# Altium schematic symbol library IC_ADI.SCHLIB: 3169 symbols (part 139 of 181) (continued)
## AD9248BSTZ-40 (continued)
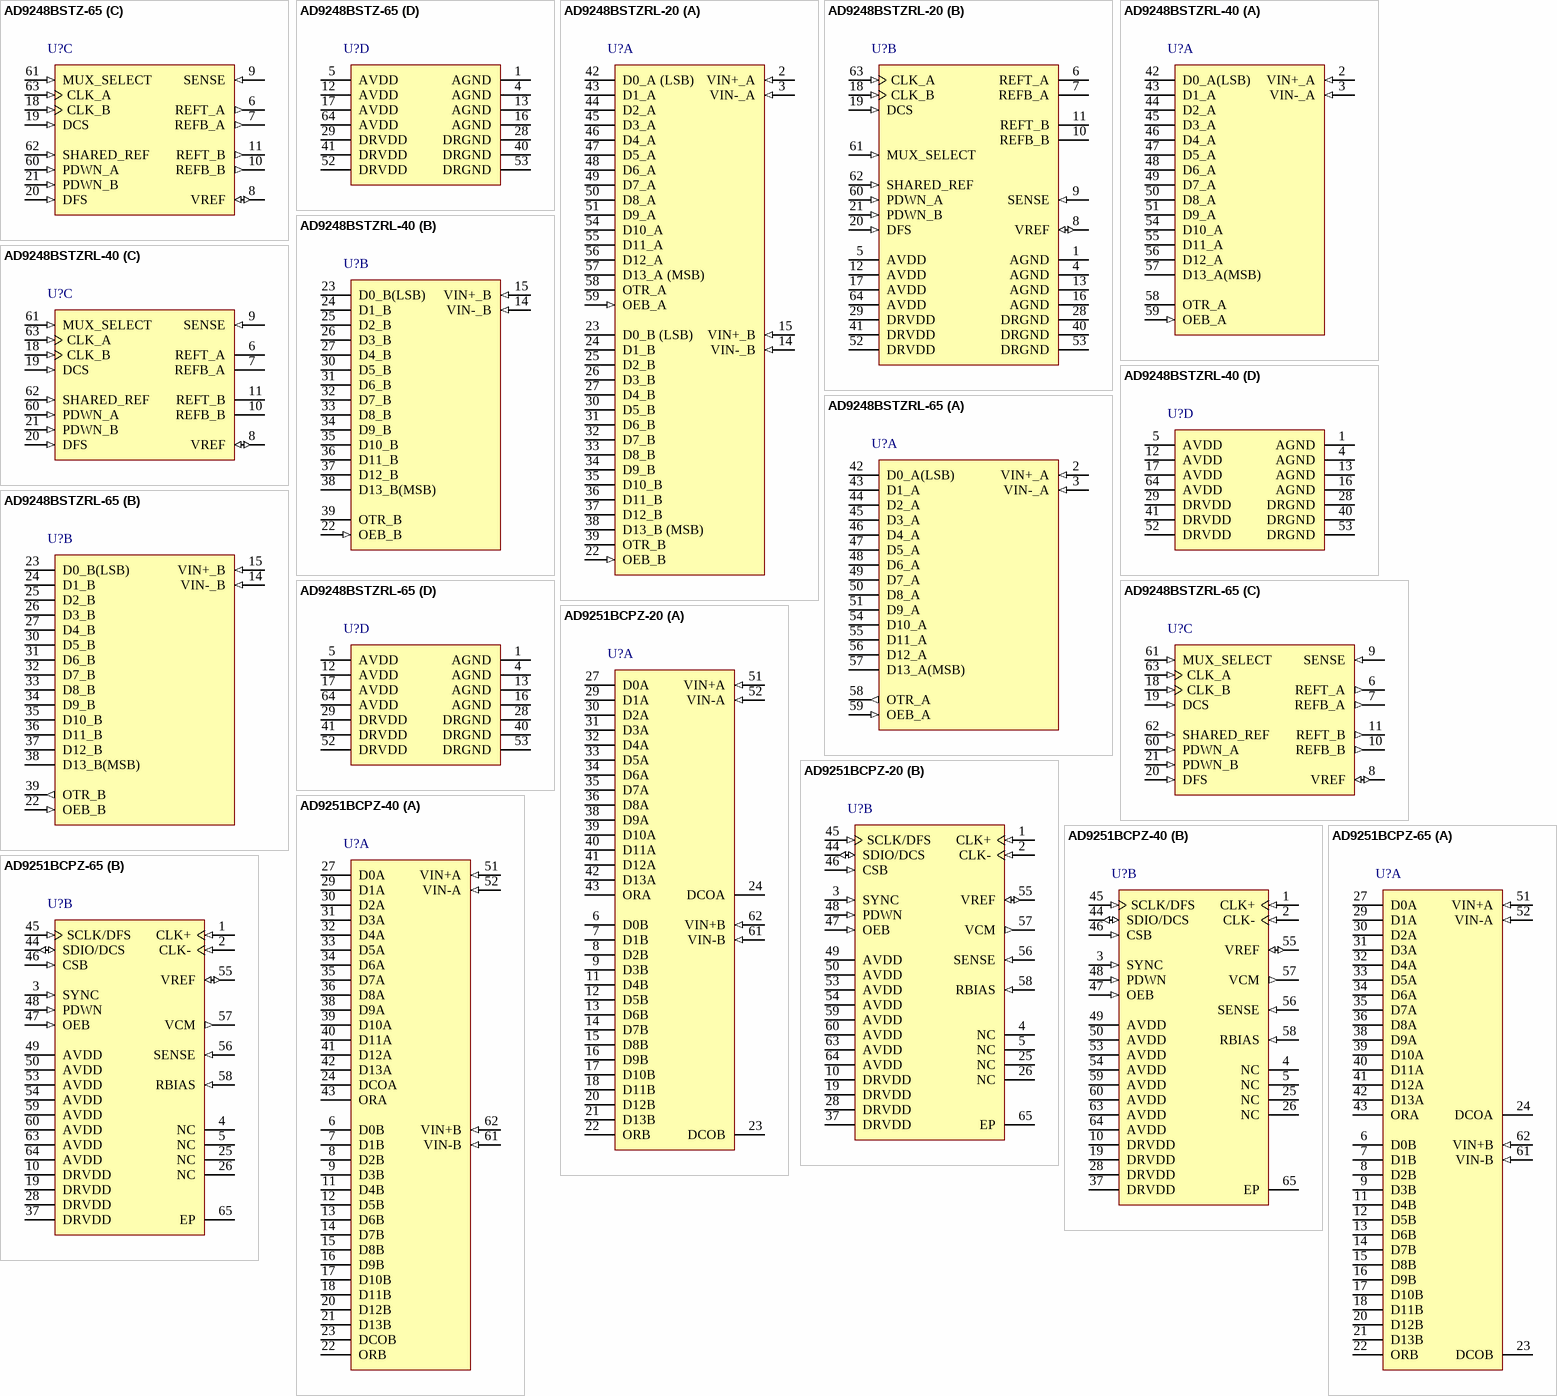
[diagram p116: symbols AD9248BSTZ-65 to AD9251BCPZ-65]

## AD9248BSTZ-65
designator U?
Dual 14-Bit Analog-to-Digital Converter with Parallel Interface, 65MSPS, -40 to +85 degC, ST-64-1, Pb-Free, Tray; Generic Part Number: AD9248-65; PartNumber: AD9248BSTZ-65; Resolution (Bits): 14; Channels: 2; Throughput Rate (SPS): 65M; Interface: Par; DatasheetVersion: Rev.B; PackageVersion: 051706-A; PackageReference: ST-64-1; PackageDescription: 64-Lead Low Profile Quad Flat Package [LQFP]; Supplier Part Number 1: AD9248BSTZ-65-ND; Supplier Part Number 2: 59K7242; Supplier Part Number 3: 584-AD9248BSTZ-65; RoHS: Y; Packing: Tray; Mounting Technology: Surface Mount; Code_JEDEC: MS-026-BBD; ComponentLink1Description: Manufacturer URL; ComponentLink2Description: Datasheet; ComponentLink3Description: Package Specification; ComponentLink4Description: Product URL
footprint LQFP64_0.4MM(10X10) (Footprint not found)
part A pins: 2 VIN+_A (in) "Analog Input Pin (+) for Channel A.", 3 VIN-_A (in) "Analog Input Pin (-) for Channel A.", 42 D0_A(LSB) (hiz) "Channel A Data Output Bits.", 43 D1_A (hiz) "Channel A Data Output Bits.", 44 D2_A (hiz) "Channel A Data Output Bits.", 45 D3_A (hiz) "Channel A Data Output Bits.", 46 D4_A (hiz) "Channel A Data Output Bits.", 47 D5_A (hiz) "Channel A Data Output Bits.", 48 D6_A (hiz) "Channel A Data Output Bits.", 49 D7_A (hiz) "Channel A Data Output Bits.", 50 D8_A (hiz) "Channel A Data Output Bits.", 51 D9_A (hiz) "Channel A Data Output Bits.", 54 D10_A (hiz) "Channel A Data Output Bits.", 55 D11_A (hiz) "Channel A Data Output Bits.", 56 D12_A (hiz) "Channel A Data Output Bits.", 57 D13_A(MSB) (hiz) "Channel A Data Output Bits.", 58 OTR_A (out) "Out-of-Range Indicator for Channel A.", 59 OEB_A (in) "Output Enable Pin for Channel A. Logic 0 enables Data Bus A. Logic 1 sets outputs to High-Z."
part B pins: 14 VIN-_B (in) "Analog Input Pin (-) for Channel B.", 15 VIN+_B (in) "Analog Input Pin (+) for Channel B.", 22 OEB_B (in) "Output Enable Pin for Channel B. Logic 0 enables Data Bus B. Logic 1 sets outputs to High-Z.", 23 D0_B(LSB) (hiz) "Channel B Data Output Bits.", 24 D1_B (hiz) "Channel B Data Output Bits.", 25 D2_B (hiz) "Channel B Data Output Bits.", 26 D3_B (hiz) "Channel B Data Output Bits.", 27 D4_B (hiz) "Channel B Data Output Bits.", 30 D5_B (hiz) "Channel B Data Output Bits.", 31 D6_B (hiz) "Channel B Data Output Bits.", 32 D7_B (hiz) "Channel B Data Output Bits.", 33 D8_B (hiz) "Channel B Data Output Bits.", 34 D9_B (hiz) "Channel B Data Output Bits.", 35 D10_B (hiz) "Channel B Data Output Bits.", 36 D11_B (hiz) "Channel B Data Output Bits.", 37 D12_B (hiz) "Channel B Data Output Bits.", 38 D13_B(MSB) (hiz) "Channel B Data Output Bits.", 39 OTR_B (out) "Out-of-Range Indicator for Channel B."
part C pins: 6 REFT_A (out) "Differential Reference (+) for Channel A.", 7 REFB_A (out) "Differential Reference (-) for Channel A.", 8 VREF (io) "Voltage Reference Input/Output.", 9 SENSE (in) "Reference Mode Selection.", 10 REFB_B (out) "Differential Reference (-) for Channel B.", 11 REFT_B (out) "Differential Reference (+) for Channel B.", 18 CLK_B (in) "Clock Input Pin for Channel B.", 19 DCS (in) "Enable Duty Cycle Stabilizer (DCS) Mode.", 20 DFS (in) "Data Output Format Select Pin (Low for Offset Binary, High for Twos Complement).", 21 PDWN_B (in) "Power-Down Function Selection for Channel B. Logic 0 enables Channel B. Logic 1 powers down Channel B (outputs static, not High-Z).", 60 PDWN_A (in) "Power-Down Function Selection for Channel A. Logic 0 enables Channel A. Logic 1 powers down Channel A (outputs static, not High-Z).", 61 MUX_SELECT (in) "Data Multiplexed Mode. (See Data Format section for how to enable; high setting disables output data multiplexed mode.)", 62 SHARED_REF (in) "Shared Reference Control Pin (Low for Independent Reference Mode, High for Shared Reference Mode).", 63 CLK_A (in) "Clock Input Pin for Channel A."
part D pins: 1 AGND (power) "Analog Ground.", 4 AGND (power) "Analog Ground.", 5 AVDD (power) "Analog Power Supply.", 12 AVDD (power) "Analog Power Supply.", 13 AGND (power) "Analog Ground.", 16 AGND (power) "Analog Ground.", 17 AVDD (power) "Analog Power Supply.", 28 DRGND (power) "Digital Output Ground.", 29 DRVDD (power) "Digital Output Driver Supply. Must be decoupled to DRGND with a minimum 0.1 uF capacitor. Recommended decoupling is 0.1 uF capacitor in parallel with 10 uF capacitor.", 40 DRGND (power) "Digital Output Ground.", 41 DRVDD (power) "Digital Output Driver Supply. Must be decoupled to DRGND with a minimum 0.1 uF capacitor. Recommended decoupling is 0.1 uF capacitor in parallel with 10 uF capacitor.", 52 DRVDD (power) "Digital Output Driver Supply. Must be decoupled to DRGND with a minimum 0.1 uF capacitor. Recommended decoupling is 0.1 uF capacitor in parallel with 10 uF capacitor.", 53 DRGND (power) "Digital Output Ground.", 64 AVDD (power) "Analog Power Supply."

## AD9248BSTZRL-20
designator U?
Dual 14-Bit Analog-to-Digital Converter with Parallel Interface, 20MSPS, -40 to +85 degC, ST-64-1, Pb-Free, Reel; Generic Part Number: AD9248-20; PartNumber: AD9248BSTZRL-20; Resolution (Bits): 14; Channels: 2; Throughput Rate (SPS): 20M; Interface: Par; DatasheetVersion: Rev.B; PackageVersion: 051706-A; PackageReference: ST-64-1; PackageDescription: 64-Lead Low Profile Quad Flat Package [LQFP]; Supplier Part Number 1: N/A; RoHS: Y; Packing: Reel; Mounting Technology: Surface Mount; Code_JEDEC: MS-026-BBD; ComponentLink1Description: Manufacturer URL; ComponentLink2Description: Datasheet; ComponentLink3Description: Package Specification; ComponentLink4Description: Product URL
footprint LQFP64_0.4MM(10X10) (Footprint not found)
part A pins: 2 VIN+_A (in) "Analog Input Pin (+) for Channel A.", 3 VIN-_A (in) "Analog Input Pin (-) for Channel A.", 14 VIN-_B (in) "Analog Input Pin (-) for Channel B.", 15 VIN+_B (in) "Analog Input Pin (+) for Channel B.", 22 OEB_B (in) "Output Enable Pin for Channel B. Logic 0 enables Data Bus B. Logic 1 sets outputs to High-Z.", 23 D0_B (LSB) (hiz) "Channel B Data Output Bits.", 24 D1_B (hiz) "Channel B Data Output Bits.", 25 D2_B (hiz) "Channel B Data Output Bits.", 26 D3_B (hiz) "Channel B Data Output Bits.", 27 D4_B (hiz) "Channel B Data Output Bits.", 30 D5_B (hiz) "Channel B Data Output Bits.", 31 D6_B (hiz) "Channel B Data Output Bits.", 32 D7_B (hiz) "Channel B Data Output Bits.", 33 D8_B (hiz) "Channel B Data Output Bits.", 34 D9_B (hiz) "Channel B Data Output Bits.", 35 D10_B (hiz) "Channel B Data Output Bits.", 36 D11_B (hiz) "Channel B Data Output Bits.", 37 D12_B (hiz) "Channel B Data Output Bits.", 38 D13_B (MSB) (hiz) "Channel B Data Output Bits.", 39 OTR_B (hiz) "Out-of-Range Indicator for Channel B.", 42 D0_A (LSB) (hiz) "Channel A Data Output Bits.", 43 D1_A (hiz) "Channel A Data Output Bits.", 44 D2_A (hiz) "Channel A Data Output Bits.", 45 D3_A (hiz) "Channel A Data Output Bits.", 46 D4_A (hiz) "Channel A Data Output Bits.", 47 D5_A (hiz) "Channel A Data Output Bits.", 48 D6_A (hiz) "Channel A Data Output Bits.", 49 D7_A (hiz) "Channel A Data Output Bits.", 50 D8_A (hiz) "Channel A Data Output Bits.", 51 D9_A (hiz) "Channel A Data Output Bits.", 54 D10_A (hiz) "Channel A Data Output Bits.", 55 D11_A (hiz) "Channel A Data Output Bits.", 56 D12_A (hiz) "Channel A Data Output Bits.", 57 D13_A (MSB) (hiz) "Channel A Data Output Bits.", 58 OTR_A (hiz) "Out-of-Range Indicator for Channel A.", 59 OEB_A (in) "Output Enable Pin for Channel A. Logic 0 enables Data Bus A. Logic 1 sets outputs to High-Z."
part B pins: 1 AGND (power) "Analog Ground.", 4 AGND (power) "Analog Ground.", 5 AVDD (power) "Analog Power Supply.", 6 REFT_A "Differential Reference (+) for Channel A.", 7 REFB_A "Differential Reference (-) for Channel A.", 8 VREF (io) "Voltage Reference Input/Output", 9 SENSE (in) "Reference Mode Selection.", 10 REFB_B "Differential Reference (-) for Channel B.", 11 REFT_B "Differential Reference (+) for Channel B.", 12 AVDD (power) "Analog Power Supply.", 13 AGND (power) "Analog Ground.", 16 AGND (power) "Analog Ground.", 17 AVDD (power) "Analog Power Supply.", 18 CLK_B (in) "Clock Input Pin for Channel B", 19 DCS (in) "Enable Duty Cycle Stabilizer (DCS) Mode", 20 DFS (in) "Data Output Format Select Pin (Low for Offset Binary, High for Twos Complement).", 21 PDWN_B (in) "Power-Down Function Selection for Channel B. Logic 0 enables Channel B. Logic 1 powers down Channel B (outputs static, not High-Z).", 28 DRGND (power) "Digital Output Ground.", 29 DRVDD (power) "Digital Output Driver Supply. Must be decoupled to DRGND with a minimum 0.1 uF capacitor. Recommended decoupling is 0.1 uF capacitor in parallel with 10 uF capacitor", 40 DRGND (power) "Digital Output Ground.", 41 DRVDD (power) "Digital Output Driver Supply. Must be decoupled to DRGND with a minimum 0.1 uF capacitor. Recommended decoupling is 0.1 uF capacitor in parallel with 10 uF capacitor.", 52 DRVDD (power) "Digital Output Ground.", 53 DRGND (power) "Digital Output Driver Supply. Must be decoupled to DRGND with a minimum 0.1 uF capacitor. Recommended decoupling is 0.1 uF capacitor in parallel with 10 uF capacitor.", 60 PDWN_A (in) "Power-Down Function Selection for Channel A.", 61 MUX_SELECT (in) "Data Multiplexed Mode (See Data Format section for how to enable; high setting disables output data multiplexed mode.)", 62 SHARED_REF (in) "Shared Reference Control Pin (Low for Independent Reference Mode, High for Shared Reference Mode).", 63 CLK_A (in) "Clock Input Pin for Channel A.", 64 AVDD (power) "Analog Power Supply."

## AD9248BSTZRL-40
designator U?
Dual 14-Bit Analog-to-Digital Converter with Parallel Interface, 40MSPS, -40 to +85 degC, ST-64-1, Pb-Free, Reel; Generic Part Number: AD9248-40; PartNumber: AD9248BSTZRL-40; Resolution (Bits): 14; Channels: 2; Throughput Rate (SPS): 40M; Interface: Par; DatasheetVersion: Rev.B; PackageVersion: 051706-A; PackageReference: ST-64-1; PackageDescription: 64-Lead Low Profile Quad Flat Package [LQFP]; Supplier Part Number 1: AD9248BSTZRL-40-ND; Supplier Part Number 2: 584-AD9248BSTZR-40; RoHS: Y; Packing: Reel; Mounting Technology: Surface Mount; Code_JEDEC: MS-026-BBD; ComponentLink1Description: Manufacturer URL; ComponentLink2Description: Datasheet; ComponentLink3Description: Package Specification; ComponentLink4Description: Product URL
footprint LQFP64_0.4MM(10X10) (Footprint not found)
part A pins: 2 VIN+_A (in) "Analog Input Pin (+) for Channel A.", 3 VIN-_A (in) "Analog Input Pin (-) for Channel A.", 42 D0_A(LSB) (hiz) "Channel A Data Output Bits.", 43 D1_A (hiz) "Channel A Data Output Bits.", 44 D2_A (hiz) "Channel A Data Output Bits.", 45 D3_A (hiz) "Channel A Data Output Bits.", 46 D4_A (hiz) "Channel A Data Output Bits.", 47 D5_A (hiz) "Channel A Data Output Bits.", 48 D6_A (hiz) "Channel A Data Output Bits.", 49 D7_A (hiz) "Channel A Data Output Bits.", 50 D8_A (hiz) "Channel A Data Output Bits.", 51 D9_A (hiz) "Channel A Data Output Bits.", 54 D10_A (hiz) "Channel A Data Output Bits.", 55 D11_A (hiz) "Channel A Data Output Bits.", 56 D12_A (hiz) "Channel A Data Output Bits.", 57 D13_A(MSB) (hiz) "Channel A Data Output Bits.", 58 OTR_A (hiz) "Out-of-Range Indicator for Channel A.", 59 OEB_A (in) "Output Enable Pin for Channel A. Logic 0 enables Data Bus A. Logic 1 sets outputs to High-Z."
part B pins: 14 VIN-_B (in) "Analog Input Pin (-) for Channel B.", 15 VIN+_B (in) "Analog Input Pin (+) for Channel B.", 22 OEB_B (in) "Output Enable Pin for Channel B. Logic 0 enables Data Bus B. Logic 1 sets outputs to High-Z.", 23 D0_B(LSB) (hiz) "Channel B Data Output Bits.", 24 D1_B (hiz) "Channel B Data Output Bits.", 25 D2_B (hiz) "Channel B Data Output Bits.", 26 D3_B (hiz) "Channel B Data Output Bits.", 27 D4_B (hiz) "Channel B Data Output Bits.", 30 D5_B (hiz) "Channel B Data Output Bits.", 31 D6_B (hiz) "Channel B Data Output Bits.", 32 D7_B (hiz) "Channel B Data Output Bits.", 33 D8_B (hiz) "Channel B Data Output Bits.", 34 D9_B (hiz) "Channel B Data Output Bits.", 35 D10_B (hiz) "Channel B Data Output Bits.", 36 D11_B (hiz) "Channel B Data Output Bits.", 37 D12_B (hiz) "Channel B Data Output Bits.", 38 D13_B(MSB) (hiz) "Channel B Data Output Bits.", 39 OTR_B (hiz) "Out-of-Range Indicator for Channel B."
part C pins: 6 REFT_A "Differential Reference (+) for Channel A.", 7 REFB_A "Differential Reference (-) for Channel A.", 8 VREF (io) "Voltage Reference Input/Output.", 9 SENSE (in) "Reference Mode Selection.", 10 REFB_B "Differential Reference (-) for Channel B.", 11 REFT_B "Differential Reference (+) for Channel B.", 18 CLK_B (in) "Clock Input Pin for Channel B.", 19 DCS (in) "Enable Duty Cycle Stabilizer (DCS) Mode.", 20 DFS (in) "Data Output Format Select Pin (Low for Offset Binary, High for Twos Complement).", 21 PDWN_B (in) "Power-Down Function Selection for Channel B. Logic 0 enables Channel B. Logic 1 powers down Channel B (outputs static, not High-Z).", 60 PDWN_A (in) "Power-Down Function Selection for Channel A. Logic 0 enables Channel A. Logic 1 powers down Channel A (outputs static, not High-Z).", 61 MUX_SELECT (in) "Data Multiplexed Mode. (See Data Format section for how to enable; high setting disables output data multiplexed mode.)", 62 SHARED_REF (in) "Shared Reference Control Pin (Low for Independent Reference Mode, High for Shared Reference Mode).", 63 CLK_A (in) "Clock Input Pin for Channel A."
part D pins: 1 AGND (power) "Analog Ground.", 4 AGND (power) "Analog Ground.", 5 AVDD (power) "Analog Power Supply.", 12 AVDD (power) "Analog Power Supply.", 13 AGND (power) "Analog Ground.", 16 AGND (power) "Analog Ground.", 17 AVDD (power) "Analog Power Supply.", 28 DRGND (power) "Digital Output Ground.", 29 DRVDD (power) "Digital Output Driver Supply. Must be decoupled to DRGND with a minimum 0.1 uF capacitor. Recommended decoupling is 0.1 uF capacitor in parallel with 10 uF capacitor.", 40 DRGND (power) "Digital Output Ground.", 41 DRVDD (power) "Digital Output Driver Supply. Must be decoupled to DRGND with a minimum 0.1 uF capacitor. Recommended decoupling is 0.1 uF capacitor in parallel with 10 uF capacitor.", 52 DRVDD (power) "Digital Output Driver Supply. Must be decoupled to DRGND with a minimum 0.1 uF capacitor. Recommended decoupling is 0.1 uF capacitor in parallel with 10 uF capacitor.", 53 DRGND (power) "Digital Output Ground.", 64 AVDD (power) "Analog Power Supply."

## AD9248BSTZRL-65
designator U?
Dual 14-Bit Analog-to-Digital Converter with Parallel Interface, 65MSPS, -40 to +85 degC, ST-64-1, Pb-Free, Reel; Generic Part Number: AD9248-65; PartNumber: AD9248BSTZRL-65; Resolution (Bits): 14; Channels: 2; Throughput Rate (SPS): 65M; Interface: Par; DatasheetVersion: Rev.B; PackageVersion: 051706-A; PackageReference: ST-64-1; PackageDescription: 64-Lead Low Profile Quad Flat Package [LQFP]; Supplier Part Number 1: AD9248BSTZRL-65-ND; Supplier Part Number 2: 584-AD9248BSTZR-65; RoHS: Y; Packing: Reel; Mounting Technology: Surface Mount; Code_JEDEC: MS-026-BBD; ComponentLink1Description: Manufacturer URL; ComponentLink2Description: Datasheet; ComponentLink3Description: Package Specification; ComponentLink4Description: Product URL
footprint LQFP64_0.4MM(10X10) (Footprint not found)
part A pins: 2 VIN+_A (in) "Analog Input Pin (+) for Channel A.", 3 VIN-_A (in) "Analog Input Pin (-) for Channel A.", 42 D0_A(LSB) (hiz) "Channel A Data Output Bits.", 43 D1_A (hiz) "Channel A Data Output Bits.", 44 D2_A (hiz) "Channel A Data Output Bits.", 45 D3_A (hiz) "Channel A Data Output Bits.", 46 D4_A (hiz) "Channel A Data Output Bits.", 47 D5_A (hiz) "Channel A Data Output Bits.", 48 D6_A (hiz) "Channel A Data Output Bits.", 49 D7_A (hiz) "Channel A Data Output Bits.", 50 D8_A (hiz) "Channel A Data Output Bits.", 51 D9_A (hiz) "Channel A Data Output Bits.", 54 D10_A (hiz) "Channel A Data Output Bits.", 55 D11_A (hiz) "Channel A Data Output Bits.", 56 D12_A (hiz) "Channel A Data Output Bits.", 57 D13_A(MSB) (hiz) "Channel A Data Output Bits.", 58 OTR_A (out) "Out-of-Range Indicator for Channel A.", 59 OEB_A (in) "Output Enable Pin for Channel A. Logic 0 enables Data Bus A. Logic 1 sets outputs to High-Z."
part B pins: 14 VIN-_B (in) "Analog Input Pin (-) for Channel B.", 15 VIN+_B (in) "Analog Input Pin (+) for Channel B.", 22 OEB_B (in) "Output Enable Pin for Channel B. Logic 0 enables Data Bus B. Logic 1 sets outputs to High-Z.", 23 D0_B(LSB) (hiz) "Channel B Data Output Bits.", 24 D1_B (hiz) "Channel B Data Output Bits.", 25 D2_B (hiz) "Channel B Data Output Bits.", 26 D3_B (hiz) "Channel B Data Output Bits.", 27 D4_B (hiz) "Channel B Data Output Bits.", 30 D5_B (hiz) "Channel B Data Output Bits.", 31 D6_B (hiz) "Channel B Data Output Bits.", 32 D7_B (hiz) "Channel B Data Output Bits.", 33 D8_B (hiz) "Channel B Data Output Bits.", 34 D9_B (hiz) "Channel B Data Output Bits.", 35 D10_B (hiz) "Channel B Data Output Bits.", 36 D11_B (hiz) "Channel B Data Output Bits.", 37 D12_B (hiz) "Channel B Data Output Bits.", 38 D13_B(MSB) (hiz) "Channel B Data Output Bits.", 39 OTR_B (out) "Out-of-Range Indicator for Channel B."
part C pins: 6 REFT_A (out) "Differential Reference (+) for Channel A.", 7 REFB_A (out) "Differential Reference (-) for Channel A.", 8 VREF (io) "Voltage Reference Input/Output.", 9 SENSE (in) "Reference Mode Selection.", 10 REFB_B (out) "Differential Reference (-) for Channel B.", 11 REFT_B (out) "Differential Reference (+) for Channel B.", 18 CLK_B (in) "Clock Input Pin for Channel B.", 19 DCS (in) "Enable Duty Cycle Stabilizer (DCS) Mode.", 20 DFS (in) "Data Output Format Select Pin (Low for Offset Binary, High for Twos Complement).", 21 PDWN_B (in) "Power-Down Function Selection for Channel B. Logic 0 enables Channel B. Logic 1 powers down Channel B (outputs static, not High-Z).", 60 PDWN_A (in) "Power-Down Function Selection for Channel A. Logic 0 enables Channel A. Logic 1 powers down Channel A (outputs static, not High-Z).", 61 MUX_SELECT (in) "Data Multiplexed Mode. (See Data Format section for how to enable; high setting disables output data multiplexed mode.)", 62 SHARED_REF (in) "Shared Reference Control Pin (Low for Independent Reference Mode, High for Shared Reference Mode).", 63 CLK_A (in) "Clock Input Pin for Channel A."
part D pins: 1 AGND (power) "Analog Ground.", 4 AGND (power) "Analog Ground.", 5 AVDD (power) "Analog Power Supply.", 12 AVDD (power) "Analog Power Supply.", 13 AGND (power) "Analog Ground.", 16 AGND (power) "Analog Ground.", 17 AVDD (power) "Analog Power Supply.", 28 DRGND (power) "Digital Output Ground.", 29 DRVDD (power) "Digital Output Driver Supply. Must be decoupled to DRGND with a minimum 0.1 uF capacitor. Recommended decoupling is 0.1 uF capacitor in parallel with 10 uF capacitor.", 40 DRGND (power) "Digital Output Ground.", 41 DRVDD (power) "Digital Output Driver Supply. Must be decoupled to DRGND with a minimum 0.1 uF capacitor. Recommended decoupling is 0.1 uF capacitor in parallel with 10 uF capacitor.", 52 DRVDD (power) "Digital Output Driver Supply. Must be decoupled to DRGND with a minimum 0.1 uF capacitor. Recommended decoupling is 0.1 uF capacitor in parallel with 10 uF capacitor.", 53 DRGND (power) "Digital Output Ground.", 64 AVDD (power) "Analog Power Supply."

## AD9251BCPZ-20
designator U?
Dual 14-Bit Analog-to-Digital Converter with Parallel Interface, 1.8 V, 20MSPS, -40 to +85 degC, CP-64-4, Pb-Free, Tray; Generic Part Number: AD9251-20; PartNumber: AD9251BCPZ-20; Resolution (Bits): 14; Channels: 2; Throughput Rate (SPS): 20M; Interface: Par; DatasheetVersion: Rev.A; PackageVersion: 051007-C; PackageReference: CP-64-4; PackageDescription: 64-Lead Lead Frame Chip Scale Package [LFCSP_VQ] 9 x 9 mm Body, Very Thin Quad; Supplier Part Number 1: AD9251BCPZ-20-ND; Supplier Part Number 2: 26R2497; Supplier Part Number 3: 584-AD9251BCPZ-20; RoHS: Y; Packing: Tray; Mounting Technology: Surface Mount; Code_JEDEC: MO-220-VMMD-4; ComponentLink1Description: Manufacturer URL; ComponentLink2Description: Datasheet; ComponentLink3Description: Package Specification; ComponentLink4Description: Product URL
footprint QFN64_0.5-PAD(9X9) (Footprint not found)
part A pins: 6 D0B (hiz) "Channel B Digital Outputs.", 7 D1B (hiz) "Channel B Digital Outputs.", 8 D2B (hiz) "Channel B Digital Outputs.", 9 D3B (hiz) "Channel B Digital Outputs.", 11 D4B (hiz) "Channel B Digital Outputs.", 12 D5B (hiz) "Channel B Digital Outputs.", 13 D6B (hiz) "Channel B Digital Outputs.", 14 D7B (hiz) "Channel B Digital Outputs.", 15 D8B (hiz) "Channel B Digital Outputs.", 16 D9B (hiz) "Channel B Digital Outputs.", 17 D10B (hiz) "Channel B Digital Outputs.", 18 D11B (hiz) "Channel B Digital Outputs.", 20 D12B (hiz) "Channel B Digital Outputs.", 21 D13B (hiz) "Channel B Digital Outputs. D13B = MSB.", 22 ORB (hiz) "Channel B Out-of-Range Digital Output.", 23 DCOB (hiz) "Channel B Data Clock Digital Output.", 24 DCOA (hiz) "Channel A Data Clock Digital Output.", 27 D0A (hiz) "Channel A Digital Outputs.", 29 D1A (hiz) "Channel A Digital Outputs.", 30 D2A (hiz) "Channel A Digital Outputs.", 31 D3A (hiz) "Channel A Digital Outputs.", 32 D4A (hiz) "Channel A Digital Outputs.", 33 D5A (hiz) "Channel A Digital Outputs.", 34 D6A (hiz) "Channel A Digital Outputs.", 35 D7A (hiz) "Channel A Digital Outputs.", 36 D8A (hiz) "Channel A Digital Outputs.", 38 D9A (hiz) "Channel A Digital Outputs.", 39 D10A (hiz) "Channel A Digital Outputs.", 40 D11A (hiz) "Channel A Digital Outputs.", 41 D12A (hiz) "Channel A Digital Outputs.", 42 D13A (hiz) "Channel A Digital Outputs. D13A = MSB.", 43 ORA (hiz) "Channel A Out-of-Range Digital Output.", 51 VIN+A (in) "Channel A Analog Inputs.", 52 VIN-A (in) "Channel A Analog Inputs", 61 VIN-B (in) "Channel B Analog Inputs.", 62 VIN+B (in) "Channel B Analog Inputs."
part B pins: 1 CLK+ (in) "Differential Encode Clock. PECL, LVDS, or 1.8 V CMOS inputs.", 2 CLK- (in) "Differential Encode Clock. PECL, LVDS, or 1.8 V CMOS inputs.", 3 SYNC (in) "Digital Input. SYNC input to clock divider. 30 kohm internal pull-down.", 4 NC "Do Not Connect.", 5 NC "Do Not Connect.", 10 DRVDD (power) "Digital Output Driver Supply (1.8 V to 3.3 V).", 19 DRVDD (power) "Digital Output Driver Supply (1.8 V to 3.3 V).", 25 NC "Do Not Connect.", 26 NC "Do Not Connect.", 28 DRVDD (power) "Digital Output Driver Supply (1.8 V to 3.3 V).", 37 DRVDD (power) "Digital Output Driver Supply (1.8 V to 3.3 V).", 44 SDIO/DCS (io) "SPI Data Input/Output (SDIO). Bidirectional SPI Data I/O in SPI mode. 30 kohm internal pull down in SPI mode.  Duty Cycle Stabilizer (DCS). Static enable input for duty cycle stabilizer in non-SPI mode 30 kohm internal (See Datasheet)", 45 SCLK/DFS (in) "SPI Clock (SCLK) Input in SPI mode. 30 kohm internal pull-down.  Data Format Select (DFS). Static control of data output format in non-SPI mode. 30 kohm internal pull-down.DFS high = twos complement output.  DFS low = offset (See Datasheet)", 46 CSB (in) "SPI Chip Select. Active low enable; 30 kohm internal pull-up.", 47 OEB (in) "Digital Input. Enable Channel A and Channel B digital outputs if low, tristate outputs if high.30 kohm internal pull-down.", 48 PDWN (in) "Digital Input. 30 kΩ internal pull-down.  PDWN high = power-down device.PDWN low =  run device, normal operation.", 49 AVDD (power) "1.8 V Analog Supply Pins.", 50 AVDD (power) "1.8 V Analog Supply Pins.", 53 AVDD (power) "1.8 V Analog Supply Pins.", 54 AVDD (power) "1.8 V Analog Supply Pins.", 55 VREF (io) "Voltage Reference Input/Output.", 56 SENSE (in) "Reference Mode Selection.", 57 VCM (out) "Analog output voltage at midsupply to set common mode of the analog inputs.", 58 RBIAS (in) "Sets Analog Current Bias. Connect to 10 kohm (1% tolerance) resistor to ground.", 59 AVDD (power) "1.8 V Analog Supply Pins.", 60 AVDD (power) "1.8 V Analog Supply Pins.", 63 AVDD (power) "1.8 V Analog Supply Pins.", 64 AVDD (power) "1.8 V Analog Supply Pins.", 65 EP (power) "Exposed paddle is the only ground connection for the chip. Must be connected to PCB AGND."

## AD9251BCPZ-40
designator U?
Dual 14-Bit Analog-to-Digital Converter with Parallel Interface, 1.8 V 40MSPS, -40 to +85 degC, CP-64-4, Pb-Free, Tray; Generic Part Number: AD9251-40; PartNumber: AD9251BCPZ-40; Resolution (Bits): 14; Channels: 2; Throughput Rate (SPS): 40M; Interface: Par; DatasheetVersion: Rev.A; PackageVersion: 051007-C; PackageReference: CP-64-4; PackageDescription: 64-Lead Lead Frame Chip Scale Package [LFCSP_VQ] 9 x 9 mm Body, Very Thin Quad; Supplier Part Number 1: AD9251BCPZ-40-ND; Supplier Part Number 2: 584-AD9251BCPZ-40; RoHS: Y; Packing: Tray; Mounting Technology: Surface Mount; Code_JEDEC: MO-220-VMMD-4; ComponentLink1Description: Manufacturer URL; ComponentLink2Description: Datasheet; ComponentLink3Description: Package Specification; ComponentLink4Description: Product URL
footprint QFN64_0.5-PAD(9X9) (Footprint not found)
part A pins: 6 D0B (hiz) "Channel B Digital Outputs.", 7 D1B (hiz) "Channel B Digital Outputs.", 8 D2B (hiz) "Channel B Digital Outputs.", 9 D3B (hiz) "Channel B Digital Outputs.", 11 D4B (hiz) "Channel B Digital Outputs.", 12 D5B (hiz) "Channel B Digital Outputs.", 13 D6B (hiz) "Channel B Digital Outputs.", 14 D7B (hiz) "Channel B Digital Outputs.", 15 D8B (hiz) "Channel B Digital Outputs.", 16 D9B (hiz) "Channel B Digital Outputs.", 17 D10B (hiz) "Channel B Digital Outputs.", 18 D11B (hiz) "Channel B Digital Outputs.", 20 D12B (hiz) "Channel B Digital Outputs.", 21 D13B (hiz) "Channel B Digital Outputs. D13B = MSB.", 22 ORB (hiz) "Channel B Out-of-Range Digital Output.", 23 DCOB (hiz) "Channel B Data Clock Digital Output.", 24 DCOA (hiz) "Channel A Data Clock Digital Output.", 27 D0A (hiz) "Channel A Digital Outputs.", 29 D1A (hiz) "Channel A Digital Outputs.", 30 D2A (hiz) "Channel A Digital Outputs.", 31 D3A (hiz) "Channel A Digital Outputs.", 32 D4A (hiz) "Channel A Digital Outputs.", 33 D5A (hiz) "Channel A Digital Outputs.", 34 D6A (hiz) "Channel A Digital Outputs.", 35 D7A (hiz) "Channel A Digital Outputs.", 36 D8A (hiz) "Channel A Digital Outputs.", 38 D9A (hiz) "Channel A Digital Outputs.", 39 D10A (hiz) "Channel A Digital Outputs.", 40 D11A (hiz) "Channel A Digital Outputs.", 41 D12A (hiz) "Channel A Digital Outputs.", 42 D13A (hiz) "Channel A Digital Outputs. D13A = MSB.", 43 ORA (hiz) "Channel A Out-of-Range Digital Output.", 51 VIN+A (in) "Channel A Analog Inputs.", 52 VIN-A (in) "Channel A Analog Inputs.", 61 VIN-B (in) "Channel B Analog Inputs.", 62 VIN+B (in) "Channel B Analog Inputs."
part B pins: 1 CLK+ (in) "Differential Encode Clock. PECL, LVDS, or 1.8 V CMOS inputs.", 2 CLK- (in) "Differential Encode Clock. PECL, LVDS, or 1.8 V CMOS inputs.", 3 SYNC (in) "Digital Input. SYNC input to clock divider. 30K ohm internal pull-down.", 4 NC "Do Not Connect.", 5 NC "Do Not Connect.", 10 DRVDD (power) "Digital Output Driver Supply (1.8 V to 3.3 V).", 19 DRVDD (power) "Digital Output Driver Supply (1.8 V to 3.3 V).", 25 NC "Do Not Connect.", 26 NC "Do Not Connect.", 28 DRVDD (power) "Digital Output Driver Supply (1.8 V to 3.3 V).", 37 DRVDD (power) "Digital Output Driver Supply (1.8 V to 3.3 V).", 44 SDIO/DCS (io) "SPI Data Input/Output (SDIO). Bidirectional SPI Data I/O in SPI mode. 30K ohm internal pull-down in SPI mode. Duty Cycle Stabilizer (DCS). Static enable input for duty cycle stabilizer in non-SPI mode.30K ohm internal pull-up in (See Datasheet)", 45 SCLK/DFS (in) "SPI Clock (SCLK) Input in SPI mode. 30K ohm internal pull-down. Data Format Select (DFS). Static control of data output format in non-SPI mode. 30 K ohm internal pull-down.DFS high = twos complement output. DFS low = offset (See Datasheet)", 46 CSB (in) "SPI Chip Select. Active low enable; 30K ohm internal pull-up.", 47 OEB (in) "Digital Input. Enable Channel A and Channel B digital outputs if low, tristate outputs if high.30K ohm internal pull-down.", 48 PDWN (in) "Digital Input. 30K ohm internal pull-down.PDWN high = power-down device. PDWN low = run device, normal operation.", 49 AVDD (power) "1.8 V Analog Supply Pins.", 50 AVDD (power) "1.8 V Analog Supply Pins.", 53 AVDD (power) "1.8 V Analog Supply Pins.", 54 AVDD (power) "1.8 V Analog Supply Pins.", 55 VREF (io) "Voltage Reference Input/Output.", 56 SENSE (in) "Reference Mode Selection.", 57 VCM (out) "Analog output voltage at midsupply to set common mode of the analog inputs.", 58 RBIAS (in) "Sets Analog Current Bias. Connect to 10K ohm (1% tolerance) resistor to ground.", 59 AVDD (power) "1.8 V Analog Supply Pins.", 60 AVDD (power) "1.8 V Analog Supply Pins.", 63 AVDD (power) "1.8 V Analog Supply Pins.", 64 AVDD (power) "1.8 V Analog Supply Pins.", 65 EP (power) "Exposed paddle is the only ground connection for the chip. Must be connected to PCB AGND."